# Altium footprint library PCB_IntegratedCircuit.PcbLib: 82 footprints (part 5 of 6)
Each footprint in its own frame and in the unit in brackets; x right, y up, seen from the top. Pads: shape width x height; smd on the part's side, far side on the other; paste and mask are expansions set on the pad; w line width, h text height; cw(c..) or ccw(c..) is an arc to the next point about the centre after c.
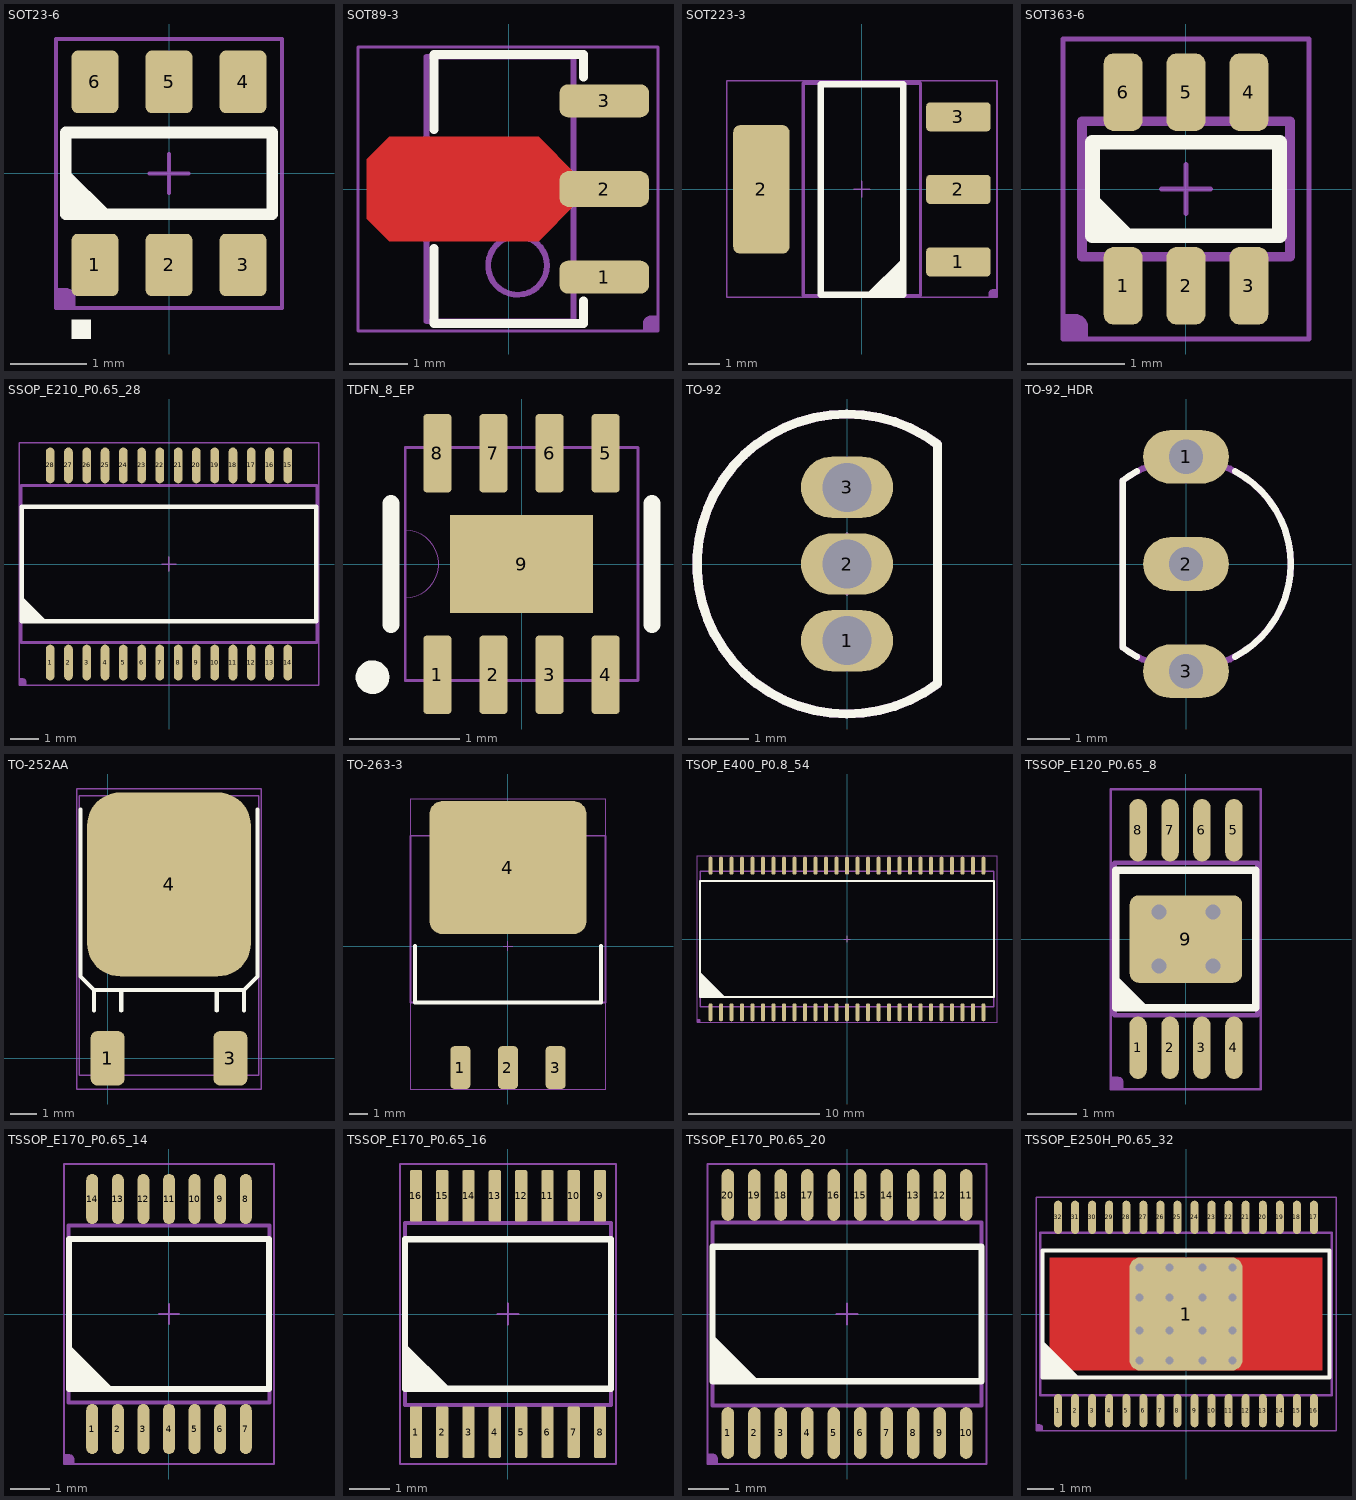
[diagram p4: the footprints below, top view; thin cyan lines are the x and y axes]

## SOT23-6 [mil]
height 62.99
pads (6):
  rrect25% 24x32 smd mask+2: 1(-38,-47) 2(0,-47) 3(38,-47) 4(38,47) 5(0,47) 6(-38,47)
Top Overlay:
  region: -50,-75 -50,-85 -40,-85 -40,-75
  region: -53,-21 -53,3 -29,-21
  lines w6: -53,-21 -53,21 53,21 53,-21 -53,-21
Mechanical 13:
  lines w2: -10,0 10,0 ; 0,-10 0,10
T-Component:
  region: -58,-69 -58,-59 -53,-59 -52.01,-59 -50.17,-59.76 -48.76,-61.17 -48,-63.01 -48,-64 -48,-69
  lines w2: -58,-69 -58,69 58,69 58,-69 -58,-69
3D body "User Library-SOT23-6-2.STEP": height 57.09, standoff 0, extent -57.09,-55.11 57.09,55.12

## SOT89-3 [mil]
height 59.06
pads (3):
  rrect50% 60x22 smd mask+2: 1(64,-59.06) 3(64,59.06)
  rrect50% 60x24 smd mask+2: 2(64,0)
Top Layer:
  region: 45,-10 20,-35 -80,-35 -95,-20 -95,20 -80,35 20,35 45,10
Top Overlay:
  lines w6: -50,-40 -50,-90 50,-90 50,-75 ; -50,40 -50,90 50,90 50,75
Mechanical 13:
  circle w3.94: c5.91,-51.18 r19.68
  lines w3.94: -25.59,0 13.78,0 ; -5.91,-19.68 -5.91,19.69 ; -55.12,-88.58 43.31,-88.58 43.31,88.58 -55.12,88.58 -55.12,-88.58
T-Component:
  region: 100,-95 90,-95 90,-90 90,-89.01 90.76,-87.17 92.17,-85.76 94.01,-85 95,-85 100,-85
  lines w2: -101,-95 100,-95 100,95 -101,95 -101,-95
3D body "SOT89-150P410X150-3N.step": height 60.06, standoff 1, extent -74.81,-88.45 82.67,88.44

## SOT223-3 [mil]
height 70.87
pads (4):
  rrect25% 80x36 smd: 1(120,-90.16) 2(120,0) 3(120,90.16)
  rrect25% 70x160 smd: 2(-125,0)
Top Overlay:
  region: 51.18,-131 5,-131 51.18,-84.82
  lines w8: -51.18,-131 -51.18,131 51.18,131 51.18,-131 -51.18,-131
Mechanical 13:
  lines w2: -10,0 10,0 ; 0,-10 0,10
  lines w3.94: -72.83,-131.89 -72.83,131.89 72.83,131.89 72.83,-131.89 -72.83,-131.89
T-Component:
  region: 168,-134 158,-134 158,-129 158,-128.01 158.76,-126.17 160.17,-124.76 162.01,-124 163,-124 168,-124
  lines w2: -168,-134 -168,135 168,135 168,-134 -168,-134
3D body "SOT223-4.STEP": height 70.87, standoff 0, extent -143.71,-131.88 143.69,131.9

## SOT363-6 [mm]
height 1.1
pads (6):
  rrect50% 0.4x0.8 smd mask+0.051: 1(-0.65,-1) 2(0,-1) 3(0.65,-1) 4(0.65,1) 5(0,1) 6(-0.65,1)
Top Overlay:
  region: -0.965,-0.483 -0.965,-0.127 -0.61,-0.483
  lines w0.152: -0.965,-0.127 -0.61,-0.483 ; -0.965,-0.483 0.965,-0.483 0.965,0.483 -0.965,0.483 -0.965,-0.483
Mechanical 13:
  lines w0.051: -0.254,0 0.254,0 ; 0,-0.254 0,0.254
  lines w0.102: -1.075,-0.7 -1.075,0.7 1.075,0.7 1.075,-0.7 -1.075,-0.7
T-Component:
  region: -1.27,-1.549 -1.27,-1.295 -1.143,-1.295 -1.118,-1.295 -1.071,-1.315 -1.035,-1.35 -1.016,-1.397 -1.016,-1.422 -1.016,-1.549
  lines w0.051: -1.27,-1.549 -1.27,1.549 1.27,1.549 1.27,-1.549 -1.27,-1.549
3D body "SW3dPS-SC70-6.STEP": height 0.93, standoff -0.02, extent -1,-1.05 1,1.05

## SSOP_E210_P0.65_28 [mil]
height 78.74
pads (28):
  oval 12x50 smd: 1(-166.34,-138) 2(-140.75,-138) 3(-115.16,-138) 4(-89.57,-138) 5(-63.98,-138) 6(-38.39,-138) 7(-12.8,-138) 8(12.8,-138) 9(38.39,-138) 10(63.98,-138) 11(89.57,-138) 12(115.16,-138) 13(140.75,-138) 14(166.34,-138) 15(166.34,138) 16(140.75,138) 17(115.16,138) 18(89.57,138) 19(63.98,138) 20(38.39,138) 21(12.8,138) 22(-12.8,138) 23(-38.39,138) 24(-63.98,138) 25(-89.57,138) 26(-115.16,138) 27(-140.75,138) 28(-166.34,138)
Top Overlay:
  region: -206,-80 -206,-45 -171,-80
  lines w6: -206,-80 -206,80 206,80 206,-80 -206,-80
Mechanical 13:
  lines w2: -10,0 10,0 ; 0,-10 0,10
  lines w4: -207,-110 -207,110 207,110 207,-110 -207,-110
T-Component:
  region: -210,-170 -210,-160 -205,-160 -204.01,-160 -202.17,-160.76 -200.76,-162.17 -200,-164.01 -200,-165 -200,-170
  lines w2: -210,-170 210,-170 210,170 -210,170 -210,-170
3D body "User Library-SSOP-28-1.STEP": height 84.65, standoff 0, extent -203.35,-152.66 203.34,152.68

## TDFN_8_EP [mil]
pads (9):
  rrect25% 10x28 smd paste+0 mask+2: 1(-30,-39.5) 2(-10,-39.5) 3(10,-39.5) 4(30,-39.5) 5(30,39.5) 6(10,39.5) 7(-10,39.5) 8(-30,39.5)
  rect 51x35 smd paste-25 mask+2: 9(0,0)
Top Overlay:
  circle w6: c-53.15,-40.35 r3
  lines w6: -46.5,-21.58 -46.5,21.58 ; 46.5,-21.58 46.5,21.58
Top Paste:
  region: -25.5,17.5 -25.5,-17.5 25.5,-17.5 25.5,17.5
Mechanical 13:
  lines w0: -41.5,-12 ccw(c-41.5,0) -41.5,12
  lines w1: -41.5,-41.5 -41.5,41.5 41.5,41.5 41.5,-41.5 -41.5,-41.5
3D body "21-0168E_T822-3.step": height 31.3, standoff -0.79, extent -41.5,-41.5 41.5,41.5

## TO-92 [mil]
pads (3):
  oval 60x40 hole 32: 1(0,-50) 2(0,0) 3(0,50)
Top Overlay:
  lines w6: 59.06,-77.95 cw(c0,0) 59.06,77.95 59.05,-77.95
Mechanical 13:
  lines w2: -10,0 10,0 ; 0,-10 0,10
  lines w6: 59.06,-77.95 cw(c0,0) 59.06,77.95 59.05,-77.95
B-Component:
  lines w2: -20,0 20,0 ; 0,-20 0,20
3D body "SW3dPS-TO-92.STEP": height 405.76, standoff -228.35, extent -120,-124.1 69.37,120

## TO-92_HDR [mil]
pads (3):
  oval 80x50 hole 32: 1(0,100) 2(0,0) 3(0,-100)
Top Overlay:
  lines w6: -45.76,-86.43 cw(c0,0) -59.06,-77.95 -59.05,77.95 cw(c0,0) -45.76,86.43 ; 45.76,-86.43 ccw(c0,0) 45.76,86.43
Mechanical 13:
  lines w2: -10,0 10,0 ; 0,-10 0,10
  lines w6: -59.06,-77.95 ccw(c0,0) -59.06,77.95 -59.05,-77.95
B-Component:
  lines w2: -20,0 20,0 ; 0,-20 0,20
3D body "User Library-TO-92-4.STEP": height 409.84, standoff -300, extent -60.24,-112.28 104.72,113.7

## TO-252AA [mil]
pads (3):
  rrect40% 50x80 smd: 1(0,0) 3(180,0)
  rrect40% 240x270 smd: 4(90,255)
Top Overlay:
  lines w6: -40,365 -40,120 -20,100 ; -20,70 -20,100 ; 20,70 20,100 ; 160,70 160,100 ; 200,70 200,100 ; 220,365 220,120 200,100 ; -20,100 200,100
Mechanical 13:
  lines w2: -42,-25 222,-25 222,385 -42,385 -42,-25
T-Component:
  lines w2: -45,-45 -45,395 225,395 225,-45 -45,-45
3D body "TO-252.STEP": height 90.56, standoff -4.52, extent -38.73,-16.77 218.75,374.5

## TO-263-3 [mil]
height 182.68
pads (4):
  rrect40% 42x90 smd: 1(-100,-255) 2(0,-255) 3(100,-255)
  rrect20% 330x280 smd: 4(0,165)
Top Overlay:
  lines w8: -195,0 -195,-118.11 195,-118.11 195,0
Mechanical 13:
  lines w2: -10,0 10,0 ; 0,-10 0,10
  lines w4: -204.72,-118.11 204.72,-118.11 204.72,231.89 -204.72,231.89 -204.72,-118.11
T-Component:
  lines w2: -205,-300 205,-300 205,310 -205,310 -205,-300
3D body "SW3dPS-to-263.STEP": height 184.65, standoff 0, extent -199.99,-292.88 200.01,315

## TSOP_E400_P0.8_54 [mil]
height 47.24
pads (54):
  oval 12x54 smd: 1(-409.45,-220) 2(-377.95,-220) 3(-346.46,-220) 4(-314.96,-220) 5(-283.46,-220) 6(-251.97,-220) 7(-220.47,-220) 8(-188.98,-220) 9(-157.48,-220) 10(-125.98,-220) 11(-94.49,-220) 12(-62.99,-220) 13(-31.5,-220) 14(0,-220) 15(31.5,-220) 16(62.99,-220) 17(94.49,-220) 18(125.98,-220) 19(157.48,-220) 20(188.98,-220) 21(220.47,-220) 22(251.97,-220) 23(283.47,-220) 24(314.96,-220) 25(346.46,-220) 26(377.95,-220) 27(409.45,-220) 28(409.45,220) 29(377.95,220) 30(346.46,220) 31(314.96,220) 32(283.47,220) 33(251.97,220) 34(220.47,220) 35(188.98,220) 36(157.48,220) 37(125.98,220) 38(94.49,220) 39(62.99,220) 40(31.5,220) 41(0,220) 42(-31.5,220) 43(-62.99,220) 44(-94.49,220) 45(-125.98,220) 46(-157.48,220) 47(-188.98,220) 48(-220.47,220) 49(-251.97,220) 50(-283.46,220) 51(-314.96,220) 52(-346.46,220) 53(-377.95,220) 54(-409.45,220)
Top Overlay:
  region: -440.94,-174.21 -440.94,-99.06 -365.79,-174.21
  lines w6: -440.94,-174.21 440.94,-174.21 440.94,174.21 -440.94,174.21 -440.94,-174.21
Mechanical 13:
  lines w2: -10,0 10,0 ; 0,-10 0,10
  lines w4: -440.94,-202.76 440.94,-202.76 440.94,202.76 -440.94,202.76 -440.94,-202.76
T-Component:
  region: -450,-250 -450,-240 -445,-240 -444.01,-240 -442.17,-240.76 -440.76,-242.17 -440,-244.01 -440,-245 -440,-250
  lines w2: -450,-250 450,-250 450,250 -450,250 -450,-250
3D body "SW3dPS-TSOP2-54.STEP": height 51, standoff -15.9, extent -437,-231.5 437.8,231.5

## TSSOP_E120_P0.65_8 [mil]
height 43.31
pads (9):
  oval 14x50 smd: 1(-38.39,-87) 2(-12.8,-87) 3(12.8,-87) 4(38.39,-87) 5(38.39,87) 6(12.8,87) 7(-12.8,87) 8(-38.39,87)
  rrect20% 90x70 smd: 9(0,0)
via -21.65,-21.65 diameter 20 hole 12
via -21.65,21.65 diameter 20 hole 12
via 21.65,-21.65 diameter 20 hole 12
via 21.65,21.65 diameter 20 hole 12
Top Overlay:
  region: -56,-55 -56,-29 -30,-55
  lines w6: -56,-55 56,-55 56,55 -56,55 -56,-55
Mechanical 13:
  lines w2: -10,0 10,0 ; 0,-10 0,10
  lines w3.94: -57.09,-61.02 57.09,-61.02 57.09,61.02 -57.09,61.02 -57.09,-61.02
T-Component:
  region: -60,-120 -60,-110 -55,-110 -54.01,-110 -52.17,-110.76 -50.76,-112.17 -50,-114.01 -50,-115 -50,-120
  lines w2: -60,-120 -60,120 60,120 60,-120 -60,-120
3D body "TSOP65P490X110_HS-9L.step": height 43.31, standoff 0, extent -57.09,-96.06 57.09,96.06

## TSSOP_E170_P0.65_14 [mil]
height 47.24
pads (14):
  oval 12x50 smd: 1(-76.77,-115) 2(-51.18,-115) 3(-25.59,-115) 4(0,-115) 5(25.59,-115) 6(51.18,-115) 7(76.77,-115) 8(76.77,115) 9(51.18,115) 10(25.59,115) 11(0,115) 12(-25.59,115) 13(-51.18,115) 14(-76.77,115)
Top Overlay:
  region: -100.47,-75 -100.47,-30 -55.47,-75
  lines w6: -100,-75 100,-75 100,75 -100,75 -100,-75
Mechanical 13:
  lines w2: -10,0 10,0 ; 0,-10 0,10
  lines w3.94: -100.39,-88.58 100.39,-88.58 100.39,88.58 -100.39,88.58 -100.39,-88.58
T-Component:
  region: -105,-150 -105,-140 -100,-140 -99.01,-140 -97.17,-140.76 -95.76,-142.17 -95,-144.01 -95,-145 -95,-150
  lines w2: -105,-150 105,-150 105,150 -105,150 -105,-150
3D body "User Library-tssop14-2.STEP": height 47.24, standoff 0, extent -100.4,-125.98 100.39,125.99

## TSSOP_E170_P0.65_16 [mil]
height 47.24
pads (16):
  rrect25% 12x50 smd: 1(-89.57,-115) 2(-63.98,-115) 3(-38.39,-115) 4(-12.8,-115) 5(12.8,-115) 6(38.39,-115) 7(63.98,-115) 8(89.57,-115) 9(89.57,115) 10(63.98,115) 11(38.39,115) 12(12.8,115) 13(-12.8,115) 14(-38.39,115) 15(-63.98,115) 16(-89.57,115)
Top Overlay:
  region: -100.87,-72.83 -100.87,-27.83 -55.87,-72.83
  lines w6: -100.39,-72.83 100.39,-72.83 100.39,72.83 -100.39,72.83 -100.39,-72.83
Mechanical 13:
  lines w2: -10,0 10,0 ; 0,-10 0,10
  lines w3.94: -100.39,-88.58 100.39,-88.58 100.39,88.58 -100.39,88.58 -100.39,-88.58
T-Component:
  lines w2: -105,-146 -105,146 105,146 105,-146 -105,-146
3D body "User Library-tssop16-2.STEP": height 47.24, standoff 0, extent -100.4,-125.98 100.39,125.99

## TSSOP_E170_P0.65_20 [mil]
height 47.24
pads (20):
  oval 12x50 smd: 1(-115.16,-115) 2(-89.57,-115) 3(-63.98,-115) 4(-38.39,-115) 5(-12.8,-115) 6(12.8,-115) 7(38.39,-115) 8(63.98,-115) 9(89.57,-115) 10(115.16,-115) 11(115.16,115) 12(89.57,115) 13(63.98,115) 14(38.39,115) 15(12.8,115) 16(-12.8,115) 17(-38.39,115) 18(-63.98,115) 19(-89.57,115) 20(-115.16,115)
Top Overlay:
  region: -130,-65 -130,-20 -85,-65
  lines w6: -130,-65 -130,65 130,65 130,-65 -130,-65
Mechanical 13:
  lines w2: -10,0 10,0 ; 0,-10 0,10
  lines w3.94: -129.92,-88.58 -129.92,88.58 129.92,88.58 129.92,-88.58 -129.92,-88.58
T-Component:
  region: -135,-145 -135,-135 -130,-135 -129.01,-135 -127.17,-135.76 -125.76,-137.17 -125,-139.01 -125,-140 -125,-145
  lines w2: -135,-145 135,-145 135,145 -135,145 -135,-145
3D body "User Library-TSSOP-20 6_6x4_4.STEP": height 41.69, standoff -1.62, extent -129.93,-125.98 129.91,125.99

## TSSOP_E250H_P0.65_32 [mil]
height 47.24
pads (33):
  oval 12x50 smd: 1(-191.93,-145) 2(-166.34,-145) 3(-140.75,-145) 4(-115.16,-145) 5(-89.57,-145) 6(-63.98,-145) 7(-38.39,-145) 8(-12.8,-145) 9(12.8,-145) 10(38.39,-145) 11(63.98,-145) 12(89.57,-145) 13(115.16,-145) 14(140.75,-145) 15(166.34,-145) 16(191.93,-145) 17(191.93,145) 18(166.34,145) 19(140.75,145) 20(115.16,145) 21(89.57,145) 22(63.98,145) 23(38.39,145) 24(12.8,145) 25(-12.8,145) 26(-38.39,145) 27(-63.98,145) 28(-89.57,145) 29(-115.16,145) 30(-140.75,145) 31(-166.34,145) 32(-191.93,145)
  rrect20% 170x170 smd: 1(0,0)
via -70,70 diameter 24 hole 12
via -70,-70 diameter 24 hole 12
via -70,25 diameter 24 hole 12
via -70,-25 diameter 24 hole 12
via -25,-25 diameter 24 hole 12
via -25,25 diameter 24 hole 12
via -25,-70 diameter 24 hole 12
via -25,70 diameter 24 hole 12
via 25,-70 diameter 24 hole 12
via 25,70 diameter 24 hole 12
via 25,-25 diameter 24 hole 12
via 25,25 diameter 24 hole 12
via 70,25 diameter 24 hole 12
via 70,-25 diameter 24 hole 12
via 70,70 diameter 24 hole 12
via 70,-70 diameter 24 hole 12
Top Layer:
  region: 205,-85 205,85 -205,85 -205,-85
Top Overlay:
  region: -215,-95 -215,-40 -160,-95
  lines w6: -215,-95 215,-95 215,95 -215,95 -215,-95
Mechanical 13:
  lines w2: -10,0 10,0 ; 0,-10 0,10
  lines w3.94: -218.5,-122.05 218.5,-122.05 218.5,122.05 -218.5,122.05 -218.5,-122.05
T-Component:
  region: -225,-175 -225,-165 -220,-165 -219.01,-165 -217.17,-165.76 -215.76,-167.17 -215,-169.01 -215,-170 -215,-175
  lines w2: -225,-175 -225,175 225,175 225,-175 -225,-175
3D body "SW3dPS-SSOP30-P065.STEP": height 43.26, standoff -1.57, extent -207,-157.48 180.79,157.48